# Altium footprint library Connector.PcbLib: 65 footprints (part 4 of 5)
Each footprint in its own frame and in the unit in brackets; x right, y up, seen from the top. Pads: shape width x height; smd on the part's side, far side on the other; paste and mask are expansions set on the pad; w line width, h text height; cw(c..) or ccw(c..) is an arc to the next point about the centre after c.
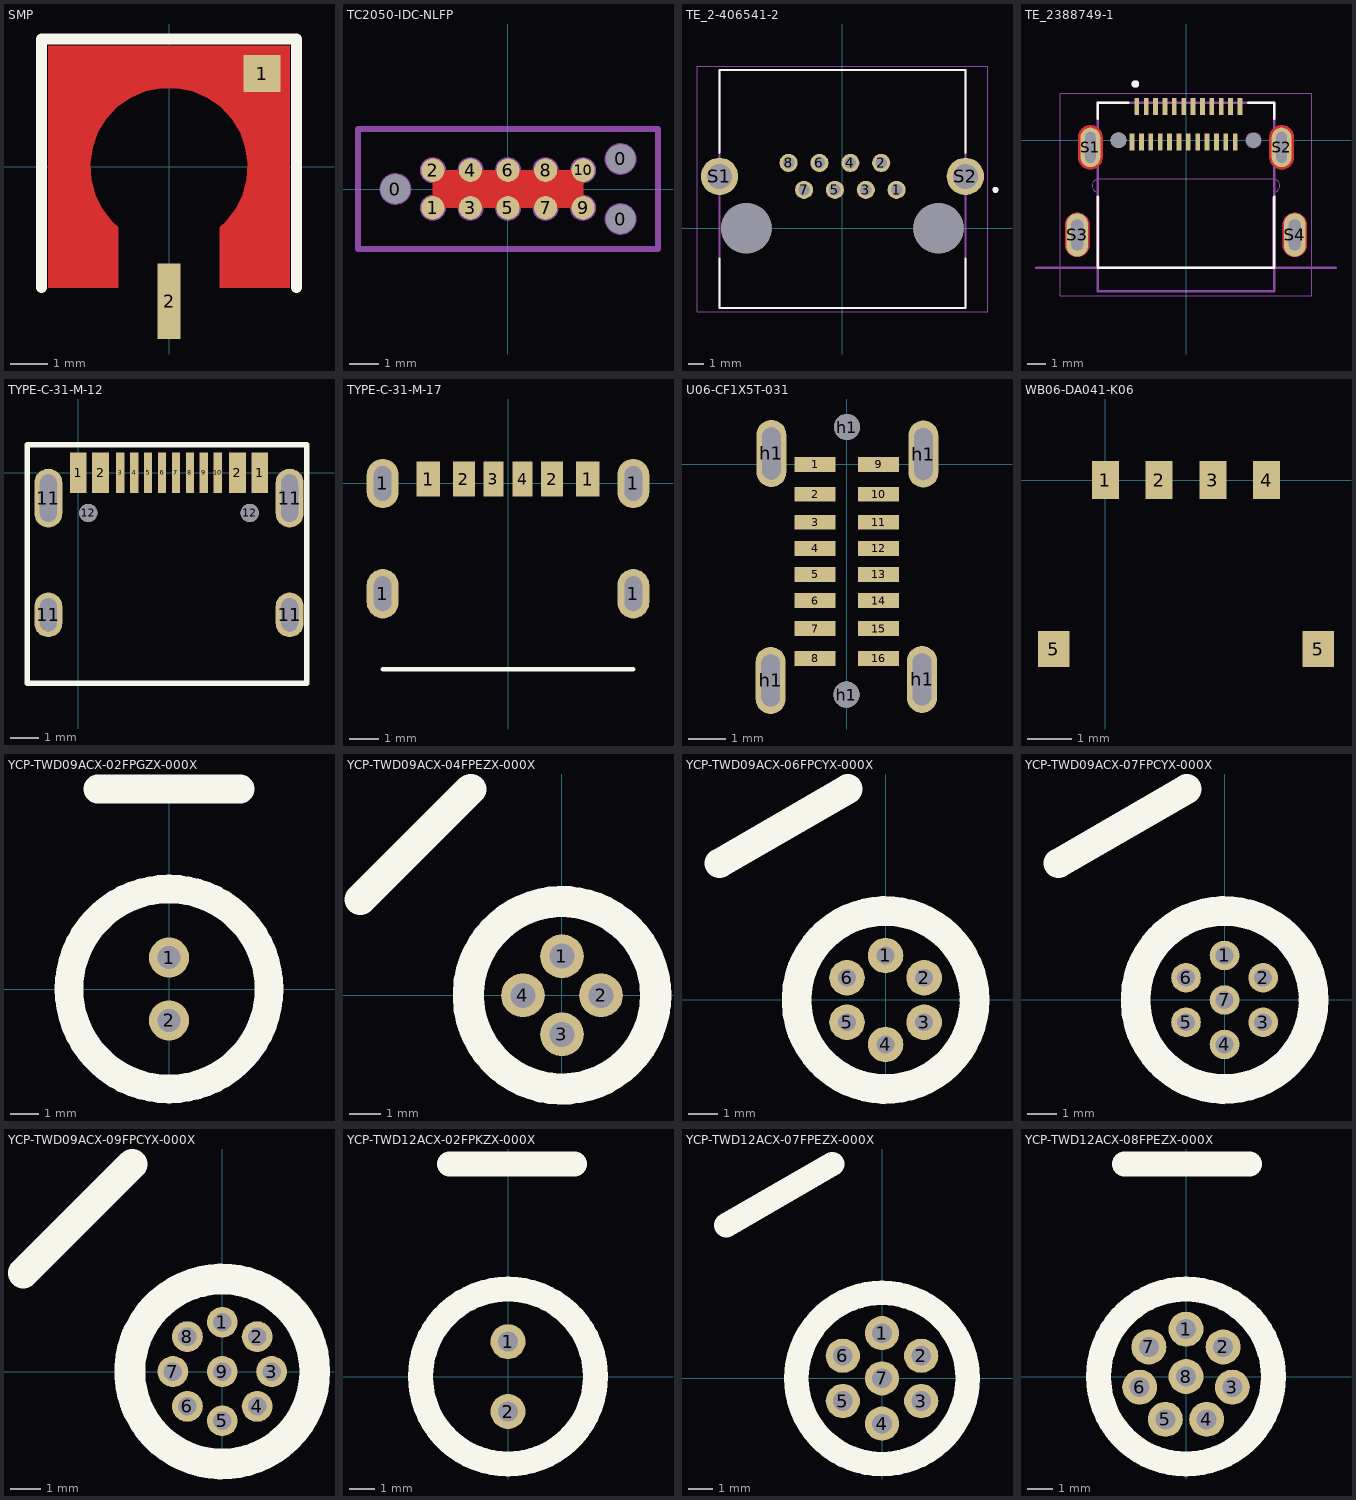
[diagram p3: the footprints below, top view; thin cyan lines are the x and y axes]

## SMP [mm] "SMP-MSLD-PCS-20"
pads (2):
  rect 1x1 smd: 1(2.5,2.5)
  rect 0.63x2.03 smd: 2(0,-3.615)
Top Layer:
  region: -3.25,-3.25 -3.25,3.25 3.25,3.25 3.25,-3.25 1.366,-3.25 1.366,-1.621 1.523,-1.474 1.79,-1.136 1.983,-0.751 2.093,-0.335 2.118,0.095 2.055,0.521 1.907,0.925 1.681,1.292 1.385,1.605 1.032,1.852 0.637,2.022 0.215,2.109 -0.215,2.109 -0.637,2.022 -1.032,1.852 -1.385,1.605 -1.681,1.292 -1.907,0.925 -2.055,0.521 -2.118,0.095 -2.093,-0.335 -1.983,-0.751 -1.79,-1.136 -1.523,-1.474 -1.366,-1.621 -1.366,-3.25
Top Overlay:
  lines w0.3: -3.429,-3.25 -3.429,3.429 3.429,3.429 3.429,-3.25
3D body "SMP-MSLD-PCS-20.stp": height 4.1, standoff 0.02, extent -2.5,-3.544 2.5,2.5

## TC2050-IDC-NLFP [mil]
pads (13):
  round 39 hole 39 unplated: 0(-150,0) 0(150,-40) 0(150,40)
  round 31 smd paste-196.85: 1(-100,-25) 2(-100,25) 3(-50,-25) 4(-50,25) 5(0,-25) 6(0,25) 7(50,-25) 8(50,25) 9(100,-25) 10(100,25)
Top Layer:
  pour cut-out: -100,25 -100,-25 100,-25 100,25
Mechanical 7:
  circle w3.94: c-100,24.99 r15.45
  circle w3.94: c-100,-24.99 r15.45
  circle w3.94: c-50,-24.99 r15.45
  circle w3.94: c0,-24.99 r15.45
  circle w3.94: c0,24.99 r15.45
  circle w3.94: c-50,24.99 r15.45
  circle w3.94: c50,24.99 r15.45
  circle w3.94: c50,-24.99 r15.45
  circle w3.94: c100,-24.99 r15.45
  circle w3.94: c100,24.99 r15.45
  circle w3.94: c150,-39.98 r19.26
  circle w3.94: c150,39.98 r19.26
  circle w3.94: c-150,0 r19.26
  text ".Designator" at -35.43,-64.96 h15
Mechanical 8:
  circle w3.94: c-150,0 r19.26
  circle w3.94: c150,39.98 r19.26
  circle w3.94: c150,-39.98 r19.26
Mechanical 15:
  lines w7.87: -199.8,-79.92 -199.8,79.92 199.8,79.92 199.8,-79.92 -199.8,-79.92

## TE_2-406541-2 [mm]
pads (12):
  round 1.2 hole 0.75: 1(3.58,2.54) 2(2.56,4.32) 3(1.54,2.54) 4(0.52,4.32) 5(-0.5,2.54) 6(-1.52,4.32) 7(-2.54,2.54) 8(-3.56,4.32)
  round 2.475 hole 1.65: S1(-8.13,3.43) S2(8.13,3.43)
  round 3.33 hole 3.33 unplated: ""(-6.35,0) ""(6.35,0)
Top Overlay:
  circle w0.2: c10.118,2.54 r0.1
  lines w0.127: -8.13,-1.985 -8.13,-5.28 8.13,-5.28 8.13,-1.985 ; -8.13,4.988 -8.13,10.47 8.13,10.47 8.13,4.988
Mechanical 13:
  circle w0.2: c10.118,2.54 r0.1
  lines w0.127: -8.13,-5.28 -8.13,10.47 8.13,10.47 8.13,-5.28 -8.13,-5.28
Mechanical 15:
  lines w0.05: -9.617,-5.53 9.617,-5.53 9.617,10.72 -9.617,10.72 -9.617,-5.53
3D body "c-2-406541-2-n-3d.stp": height 13.4, standoff -4.15, extent -8.128,-5.334 8.128,10.414

## TE_2388749-1 [mm]
height 2.88
pads (30):
  rect 0.254x0.9 smd: A1(-2.625,1.8) A2(-2.125,1.8) A3(-1.625,1.8) A4(-1.125,1.8) A5(-0.625,1.8) A6(-0.125,1.8) A7(0.375,1.8) A8(0.875,1.8) A9(1.375,1.8) A10(1.875,1.8) A11(2.375,1.8) A12(2.875,1.8) B1(2.625,-0.1) B2(2.125,-0.1) B3(1.625,-0.1) B4(1.125,-0.1) B5(0.625,-0.1) B6(0.125,-0.1) B7(-0.375,-0.1) B8(-0.875,-0.1) B9(-1.375,-0.1) B10(-1.875,-0.1) B11(-2.375,-0.1) B12(-2.875,-0.1)
  oval 1.058x2.116 hole 0.55 slot 1.65 at 90 deg mask+0: S1(-5.1,-0.38) S2(5.1,-0.38)
  oval 1.158x2.316 hole 0.65 slot 1.65 at 90 deg mask+0: S3(-5.8,-5.05) S4(5.8,-5.05)
  round 0.84 hole 0.84 unplated: ""(-3.6,0)
  round 0.78 hole 0.78 unplated: ""(3.6,0)
Top Layer:
  region: 5.868,-3.879 5.935,-3.889 6.001,-3.907 6.064,-3.931 6.125,-3.962 6.182,-3.999 6.235,-4.042 6.283,-4.09 6.326,-4.143 6.363,-4.2 6.394,-4.261 6.418,-4.324 6.436,-4.39 6.446,-4.457 6.45,-4.525 6.45,-5.575 6.446,-5.643 6.436,-5.71 6.418,-5.776 6.394,-5.839 6.363,-5.9 6.326,-5.957 6.283,-6.01 6.235,-6.058 6.182,-6.101 6.125,-6.138 6.064,-6.169 6.001,-6.193 5.935,-6.211 5.868,-6.221 5.8,-6.225 5.732,-6.221 5.665,-6.211 5.599,-6.193 5.536,-6.169 5.475,-6.138 5.418,-6.101 5.365,-6.058 5.317,-6.01 5.274,-5.957 5.237,-5.9 5.206,-5.839 5.182,-5.776 5.164,-5.71 5.154,-5.643 5.15,-5.575 5.15,-4.525 5.154,-4.457 5.164,-4.39 5.182,-4.324 5.206,-4.261 5.237,-4.2 5.274,-4.143 5.317,-4.09 5.365,-4.042 5.418,-3.999 5.475,-3.962 5.536,-3.931 5.599,-3.907 5.665,-3.889 5.732,-3.879 5.8,-3.875
  region: -5.732,-3.879 -5.665,-3.889 -5.599,-3.907 -5.536,-3.931 -5.475,-3.962 -5.418,-3.999 -5.365,-4.042 -5.317,-4.09 -5.274,-4.143 -5.237,-4.2 -5.206,-4.261 -5.182,-4.324 -5.164,-4.39 -5.154,-4.457 -5.15,-4.525 -5.15,-5.575 -5.154,-5.643 -5.164,-5.71 -5.182,-5.776 -5.206,-5.839 -5.237,-5.9 -5.274,-5.957 -5.317,-6.01 -5.365,-6.058 -5.418,-6.101 -5.475,-6.138 -5.536,-6.169 -5.599,-6.193 -5.665,-6.211 -5.732,-6.221 -5.8,-6.225 -5.868,-6.221 -5.935,-6.211 -6.001,-6.193 -6.064,-6.169 -6.125,-6.138 -6.182,-6.101 -6.235,-6.058 -6.283,-6.01 -6.326,-5.957 -6.363,-5.9 -6.394,-5.839 -6.418,-5.776 -6.436,-5.71 -6.446,-5.643 -6.45,-5.575 -6.45,-4.525 -6.446,-4.457 -6.436,-4.39 -6.418,-4.324 -6.394,-4.261 -6.363,-4.2 -6.326,-4.143 -6.283,-4.09 -6.235,-4.042 -6.182,-3.999 -6.125,-3.962 -6.064,-3.931 -6.001,-3.907 -5.935,-3.889 -5.868,-3.879 -5.8,-3.875
  region: 5.168,0.791 5.235,0.781 5.301,0.763 5.364,0.739 5.425,0.708 5.482,0.671 5.535,0.628 5.583,0.58 5.626,0.527 5.663,0.47 5.694,0.409 5.718,0.346 5.736,0.28 5.746,0.213 5.75,0.145 5.75,-0.905 5.746,-0.973 5.736,-1.04 5.718,-1.106 5.694,-1.169 5.663,-1.23 5.626,-1.287 5.583,-1.34 5.535,-1.388 5.482,-1.431 5.425,-1.468 5.364,-1.499 5.301,-1.523 5.235,-1.541 5.168,-1.551 5.1,-1.555 5.032,-1.551 4.965,-1.541 4.899,-1.523 4.836,-1.499 4.775,-1.468 4.718,-1.431 4.665,-1.388 4.617,-1.34 4.574,-1.287 4.537,-1.23 4.506,-1.169 4.482,-1.106 4.464,-1.04 4.454,-0.973 4.45,-0.905 4.45,0.145 4.454,0.213 4.464,0.28 4.482,0.346 4.506,0.409 4.537,0.47 4.574,0.527 4.617,0.58 4.665,0.628 4.718,0.671 4.775,0.708 4.836,0.739 4.899,0.763 4.965,0.781 5.032,0.791 5.1,0.795
  region: -5.032,0.791 -4.965,0.781 -4.899,0.763 -4.836,0.739 -4.775,0.708 -4.718,0.671 -4.665,0.628 -4.617,0.58 -4.574,0.527 -4.537,0.47 -4.506,0.409 -4.482,0.346 -4.464,0.28 -4.454,0.213 -4.45,0.145 -4.45,-0.905 -4.454,-0.973 -4.464,-1.04 -4.482,-1.106 -4.506,-1.169 -4.537,-1.23 -4.574,-1.287 -4.617,-1.34 -4.665,-1.388 -4.718,-1.431 -4.775,-1.468 -4.836,-1.499 -4.899,-1.523 -4.965,-1.541 -5.032,-1.551 -5.1,-1.555 -5.168,-1.551 -5.235,-1.541 -5.301,-1.523 -5.364,-1.499 -5.425,-1.468 -5.482,-1.431 -5.535,-1.388 -5.583,-1.34 -5.626,-1.287 -5.663,-1.23 -5.694,-1.169 -5.718,-1.106 -5.736,-1.04 -5.746,-0.973 -5.75,-0.905 -5.75,0.145 -5.746,0.213 -5.736,0.28 -5.718,0.346 -5.694,0.409 -5.663,0.47 -5.626,0.527 -5.583,0.58 -5.535,0.628 -5.482,0.671 -5.425,0.708 -5.364,0.739 -5.301,0.763 -5.235,0.781 -5.168,0.791 -5.1,0.795
Bottom Layer:
  region: 5.868,-3.879 5.935,-3.889 6.001,-3.907 6.064,-3.931 6.125,-3.962 6.182,-3.999 6.235,-4.042 6.283,-4.09 6.326,-4.143 6.363,-4.2 6.394,-4.261 6.418,-4.324 6.436,-4.39 6.446,-4.457 6.45,-4.525 6.45,-5.575 6.446,-5.643 6.436,-5.71 6.418,-5.776 6.394,-5.839 6.363,-5.9 6.326,-5.957 6.283,-6.01 6.235,-6.058 6.182,-6.101 6.125,-6.138 6.064,-6.169 6.001,-6.193 5.935,-6.211 5.868,-6.221 5.8,-6.225 5.732,-6.221 5.665,-6.211 5.599,-6.193 5.536,-6.169 5.475,-6.138 5.418,-6.101 5.365,-6.058 5.317,-6.01 5.274,-5.957 5.237,-5.9 5.206,-5.839 5.182,-5.776 5.164,-5.71 5.154,-5.643 5.15,-5.575 5.15,-4.525 5.154,-4.457 5.164,-4.39 5.182,-4.324 5.206,-4.261 5.237,-4.2 5.274,-4.143 5.317,-4.09 5.365,-4.042 5.418,-3.999 5.475,-3.962 5.536,-3.931 5.599,-3.907 5.665,-3.889 5.732,-3.879 5.8,-3.875
  region: -5.732,-3.879 -5.665,-3.889 -5.599,-3.907 -5.536,-3.931 -5.475,-3.962 -5.418,-3.999 -5.365,-4.042 -5.317,-4.09 -5.274,-4.143 -5.237,-4.2 -5.206,-4.261 -5.182,-4.324 -5.164,-4.39 -5.154,-4.457 -5.15,-4.525 -5.15,-5.575 -5.154,-5.643 -5.164,-5.71 -5.182,-5.776 -5.206,-5.839 -5.237,-5.9 -5.274,-5.957 -5.317,-6.01 -5.365,-6.058 -5.418,-6.101 -5.475,-6.138 -5.536,-6.169 -5.599,-6.193 -5.665,-6.211 -5.732,-6.221 -5.8,-6.225 -5.868,-6.221 -5.935,-6.211 -6.001,-6.193 -6.064,-6.169 -6.125,-6.138 -6.182,-6.101 -6.235,-6.058 -6.283,-6.01 -6.326,-5.957 -6.363,-5.9 -6.394,-5.839 -6.418,-5.776 -6.436,-5.71 -6.446,-5.643 -6.45,-5.575 -6.45,-4.525 -6.446,-4.457 -6.436,-4.39 -6.418,-4.324 -6.394,-4.261 -6.363,-4.2 -6.326,-4.143 -6.283,-4.09 -6.235,-4.042 -6.182,-3.999 -6.125,-3.962 -6.064,-3.931 -6.001,-3.907 -5.935,-3.889 -5.868,-3.879 -5.8,-3.875
  region: -5.032,0.791 -4.965,0.781 -4.899,0.763 -4.836,0.739 -4.775,0.708 -4.718,0.671 -4.665,0.628 -4.617,0.58 -4.574,0.527 -4.537,0.47 -4.506,0.409 -4.482,0.346 -4.464,0.28 -4.454,0.213 -4.45,0.145 -4.45,-0.905 -4.454,-0.973 -4.464,-1.04 -4.482,-1.106 -4.506,-1.169 -4.537,-1.23 -4.574,-1.287 -4.617,-1.34 -4.665,-1.388 -4.718,-1.431 -4.775,-1.468 -4.836,-1.499 -4.899,-1.523 -4.965,-1.541 -5.032,-1.551 -5.1,-1.555 -5.168,-1.551 -5.235,-1.541 -5.301,-1.523 -5.364,-1.499 -5.425,-1.468 -5.482,-1.431 -5.535,-1.388 -5.583,-1.34 -5.626,-1.287 -5.663,-1.23 -5.694,-1.169 -5.718,-1.106 -5.736,-1.04 -5.746,-0.973 -5.75,-0.905 -5.75,0.145 -5.746,0.213 -5.736,0.28 -5.718,0.346 -5.694,0.409 -5.663,0.47 -5.626,0.527 -5.583,0.58 -5.535,0.628 -5.482,0.671 -5.425,0.708 -5.364,0.739 -5.301,0.763 -5.235,0.781 -5.168,0.791 -5.1,0.795
  region: 5.168,0.791 5.235,0.781 5.301,0.763 5.364,0.739 5.425,0.708 5.482,0.671 5.535,0.628 5.583,0.58 5.626,0.527 5.663,0.47 5.694,0.409 5.718,0.346 5.736,0.28 5.746,0.213 5.75,0.145 5.75,-0.905 5.746,-0.973 5.736,-1.04 5.718,-1.106 5.694,-1.169 5.663,-1.23 5.626,-1.287 5.583,-1.34 5.535,-1.388 5.482,-1.431 5.425,-1.468 5.364,-1.499 5.301,-1.523 5.235,-1.541 5.168,-1.551 5.1,-1.555 5.032,-1.551 4.965,-1.541 4.899,-1.523 4.836,-1.499 4.775,-1.468 4.718,-1.431 4.665,-1.388 4.617,-1.34 4.574,-1.287 4.537,-1.23 4.506,-1.169 4.482,-1.106 4.464,-1.04 4.454,-0.973 4.45,-0.905 4.45,0.145 4.454,0.213 4.464,0.28 4.482,0.346 4.506,0.409 4.537,0.47 4.574,0.527 4.617,0.58 4.665,0.628 4.718,0.671 4.775,0.708 4.836,0.739 4.899,0.763 4.965,0.781 5.032,0.791 5.1,0.795
Top Overlay:
  circle w0.2: c-2.7,3 r0.1
  lines w0.127: -4.7,-3 -4.7,-6.8 4.7,-6.8 4.7,-3 ; -4.7,1.145 -4.7,2 -3.072,2 ; 3.322,2 4.7,2 4.7,1.145
Top Solder:
  drawing of 4 lines, arcs and shapes, not listed
Bottom Solder:
  drawing of 4 lines, arcs and shapes, not listed
Mechanical 1:
  lines w0: -4.812,-2.75 cw(c-5,-3.075) -4.625,-3.075 -4.625,-6.8 4.625,-6.8 4.625,-3.075 cw(c5,-3.075) 4.812,-2.75 ccw(c4.625,-2.425) 4.625,-2.05 -4.625,-2.05 ccw(c-4.625,-2.425) -4.812,-2.75 ; 3.57,-0.39 cw(c3.57,0) 3.57,0.39 3.63,0.39 cw(c3.63,0) 3.63,-0.39 3.57,-0.39
Mechanical 13:
  circle w0.2: c-2.7,3 r0.1
  lines w0.127: -8,-6.8 8,-6.8 ; -4.7,-8.05 4.7,-8.05 4.7,2 -4.7,2 -4.7,-8.05
  text "PCB EDGE" at 7,-6.5 h0.81
Mechanical 15:
  lines w0.05: -6.7,-8.3 6.7,-8.3 6.7,2.5 -6.7,2.5 -6.7,-8.3
3D body "step_temp.STEP": height 2.88, standoff -1, extent -5.949,-8.04 5.951,2.1

## TYPE-C-31-M-12 [mm]
pads (18):
  rect 0.6x1.45 smd: 1(0,0) 1(6.5,0) 2(0.8,0) 2(5.7,0)
  rect 0.3x1.45 smd: 3(1.5,0) 4(2,0) 5(2.5,0) 6(3,0) 7(3.5,0) 8(4,0) 9(4.5,0) 10(5,0)
  oval 1x1.6 hole 1.2 slot 0.6 at 0 deg: 11(-1.07,-5.095) 11(7.57,-5.095)
  oval 1x2.1 hole 1.7 slot 0.6 at 0 deg: 11(-1.07,-0.915) 11(7.57,-0.915)
  round 0.65 hole 0.65: 12(0.36,-1.445) 12(6.14,-1.445)
Top Overlay:
  lines w0.2: -1.825,-7.55 -1.825,1 8.175,1 8.175,-7.55 -1.825,-7.55
3D body "USB - C.step": height 3.27, standoff -0.99, extent -1.275,-7.75 7.675,0

## TYPE-C-31-M-17 [mm]
pads (10):
  oval 1.1x1.7 hole 1.2 slot 0.6 at 0 deg: 1(-4.32,-3.8) 1(-4.32,0) 1(4.32,-3.8) 1(4.32,0)
  rect 0.8x1.2 smd: 1(-2.75,0.15) 1(2.75,0.15)
  rect 0.76x1.2 smd: 2(-1.52,0.15) 2(1.52,0.15)
  rect 0.7x1.2 smd: 3(-0.5,0.15) 4(0.5,0.15)
Top Overlay:
  lines w0.15: -4.32,-6.4 4.32,-6.4
3D body "HRO_TYPE-C-31-M-12.step": height 3.16, standoff -1.04, extent -4.5,-6.45 4.45,1.45

## U06-CF1X5T-031 [mm] "Up RIght USB C 3.2"
pads (22):
  rect 1.1x0.4 smd: 1(-0.85,0) 2(-0.85,-0.8) 3(-0.85,-1.55) 4(-0.85,-2.25) 5(-0.85,-2.95) 6(-0.85,-3.65) 7(-0.85,-4.4) 8(-0.85,-5.2) 9(0.85,0) 10(0.85,-0.8) 11(0.85,-1.55) 12(0.85,-2.25) 13(0.85,-2.95) 14(0.85,-3.65) 15(0.85,-4.4) 16(0.85,-5.2)
  oval 0.8x1.8 hole 0.5 slot 1.4 at 90 deg: h1(-2.043,-5.79) h1(-2.023,0.292) h1(2.013,-5.764) h1(2.049,0.276)
  round 0.7 hole 0.7: h1(-0.014,-6.172) h1(0,1)
3D body "U06-CF1X5T-031 v1.step": height 12.51, standoff -1.49, extent -2.171,-6.719 2.189,7.281

## WB06-DA041-K06 [mm] "https://www.gradconn.com/Products/WireToBoard/Headers/WB06-DA"
pads (6):
  rect 0.6x0.85 smd: 1(0,0) 2(1.2,0) 3(2.4,0) 4(3.6,0)
  rect 0.7x0.8 smd: 5(-1.15,-3.775) 5(4.75,-3.775)
3D body "WB06-DA041-K06_rev1.0.STEP": height 1.55, standoff 0.05, extent -1.494,-4.43 5.106,0.07

## YCP-TWD09ACX-02FPGZX-000X [mm]
pads (2):
  round 1.4 hole 0.8: 1(0,1.1) 2(0,-1.1)
Top Overlay:
  circle w1: c0,0 r3.5
  lines w1: -2.5,7 2.5,7
3D body "YCP-TWD09ACX-02FPGZX-000X.step": height 16, standoff -3.95, extent -6.25,-6.25 6.25,6.25

## YCP-TWD09ACX-04FPEZX-000X [mm]
pads (4):
  round 1.4 hole 0.8: 1(0,1.25) 2(1.25,0) 3(0,-1.25) 4(-1.25,0)
Top Overlay:
  circle w1: c0,0 r3
  lines w1: -6.457,3.068 -2.921,6.604
3D body "YCP-TWD09ACX-04FPEZX-000X.step": height 16, standoff -3.95, extent -8.839,-8.839 8.839,8.839

## YCP-TWD09ACX-06FPCYX-000X [mm]
pads (6):
  round 1.2 hole 0.6: 1(0,1.5) 2(1.299,0.75) 3(1.299,-0.75) 4(0,-1.5) 5(-1.299,-0.75) 6(-1.299,0.75)
Top Overlay:
  circle w1: c0,0 r3
  lines w1: -5.6,4.612 -1.27,7.112
3D body "YCP-TWD09ACX-06FPCYX-000X.step": height 16, standoff -3.95, extent -8.538,-8.537 8.538,8.538

## YCP-TWD09ACX-07FPCYX-000X [mm]
pads (7):
  round 1 hole 0.6: 1(0,1.5) 2(1.299,0.75) 3(1.299,-0.75) 4(0,-1.5) 5(-1.299,-0.75) 6(-1.299,0.75) 7(0,0)
Top Overlay:
  circle w1: c0,0 r3
  lines w1: -5.6,4.612 -1.27,7.112
3D body "YCP-TWD09ACX-07FPCYX-000X.step": height 16, standoff -3.95, extent -8.538,-8.537 8.538,8.538

## YCP-TWD09ACX-09FPCYX-000X [mm]
pads (9):
  round 1 hole 0.6: 1(0,1.6) 2(1.131,1.131) 3(1.6,0) 4(1.131,-1.131) 5(0,-1.6) 6(-1.131,-1.131) 7(-1.6,0) 8(-1.131,1.131) 9(0,0)
Top Overlay:
  circle w1: c0,0 r3
  lines w1: -6.457,3.195 -2.921,6.731
3D body "YCP-TWD09ACX-09FPCYX-000X.step": height 16, standoff -3.95, extent -8.839,-8.839 8.839,8.839

## YCP-TWD12ACX-02FPKZX-000X [mm]
pads (2):
  round 1.4 hole 0.8: 1(0,1.4) 2(0,-1.4)
Top Overlay:
  circle w1: c0,0 r3.5
  lines w1: -2.333,8.509 2.667,8.509
3D body "YCP-TWD12ACX-02FPKZX-000X.step": height 18, standoff -3.9, extent -8,-7.937 7.874,7.937

## YCP-TWD12ACX-07FPEZX-000X [mm]
pads (7):
  round 1.4 hole 0.8: 1(0,1.85) 2(1.602,0.925) 3(1.602,-0.925) 4(0,-1.85) 5(-1.602,-0.925) 6(-1.602,0.925) 7(0,0)
Top Overlay:
  circle w1: c0,0 r3.5
  lines w1: -6.362,6.263 -2.032,8.763
3D body "YCP-TWD12ACX-07FPEZX-000X.step": height 18, standoff -3.9, extent -10.842,-10.842 10.843,10.843

## YCP-TWD12ACX-08FPEZX-000X [mm]
pads (8):
  round 1.4 hole 0.8: 1(0,1.9) 2(1.485,1.185) 3(1.852,-0.423) 4(0.825,-1.712) 5(-0.824,-1.712) 6(-1.852,-0.423) 7(-1.486,1.185) 8(0,0)
Top Overlay:
  circle w1: c0,0 r3.5
  lines w1: -2.46,8.509 2.54,8.509
3D body "YCP-TWD12ACX-08FPEZX-000X.step": height 18, standoff -3.9, extent -7.937,-7.937 7.937,7.937